# Altium integrated library WiC_v13.2.IntLib: 100 symbols
Pins are listed as number, name and electrical type; pins without a type are passive.

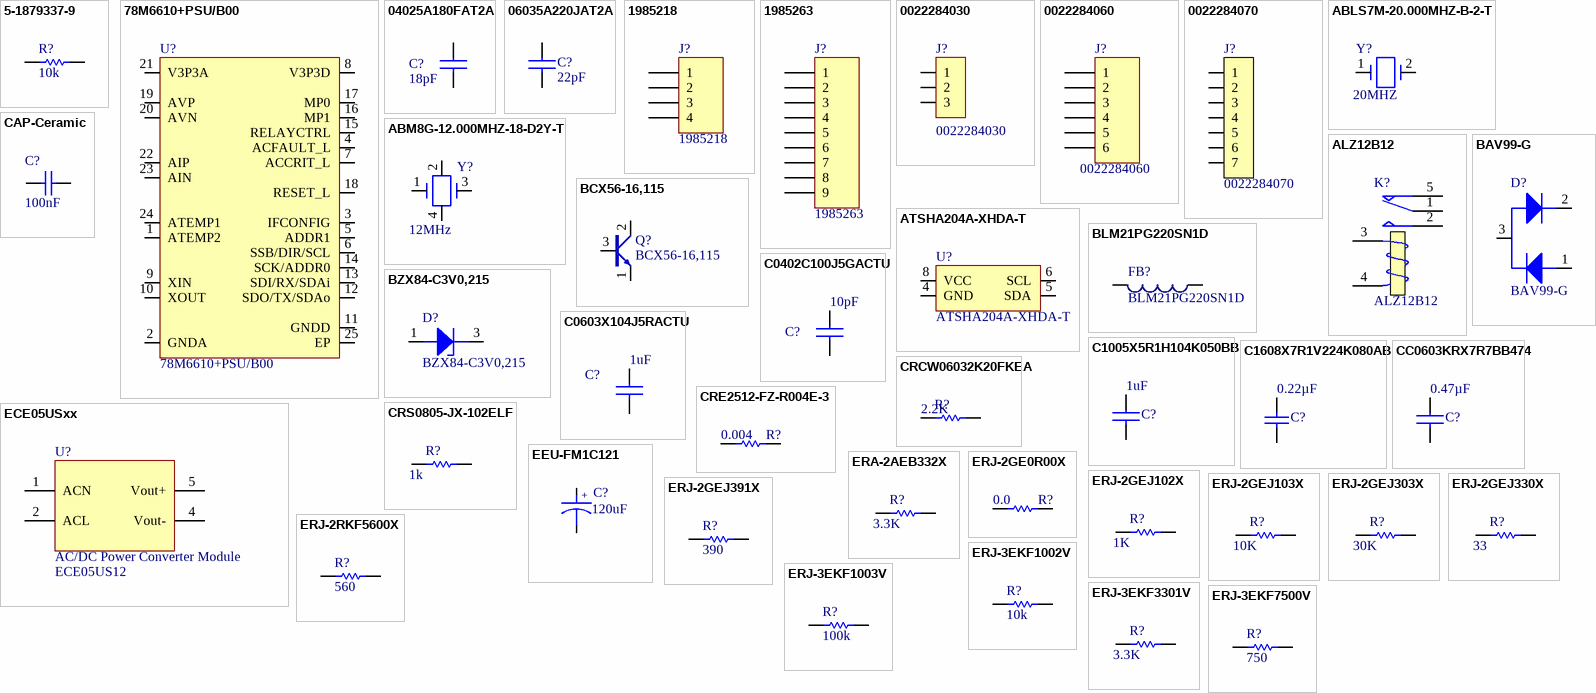
[diagram p0: symbols 5-1879337-9 to ERJ-3EKF7500V]

## 5-1879337-9
designator R?  value 10k  (hidden comment: 5-1879337-9)
RES SMD 10K OHM 1% 1/16W 0603; MFT: TE Connectivity AMP Connectors; RATING: 0.063W; MPN: 5-1879337-9; TYPE: SMD; LOAD: *
footprint R0603
pins: 1, 2

## 78M6610+PSU/B00
designator U?
IC ENERGY MEASURMENT 1PH 24TQFN; MFT: Maxim Integrated; RATING: *; VALUE: 78M6610+PSU/B00; LOAD: *; TYPE: SMD; MPN: 78M6610+PSU/B00
footprint QFN-24 (4X4mm)
pins: 1 ATEMP2, 2 GNDA, 3 IFCONFIG, 4 ACFAULT_L, 5 ADDR1, 6 SSB/DIR/SCL, 7 ACCRIT_L, 8 V3P3D, 9 XIN, 10 XOUT, 11 GNDD, 12 SDO/TX/SDAo, 13 SDI/RX/SDAi, 14 SCK/ADDR0, 15 RELAYCTRL, 16 MP1, 17 MP0, 18 RESET_L, 19 AVP, 20 AVN, 21 V3P3A, 22 AIP, 23 AIN, 24 ATEMP1, 25 EP

## 04025A180FAT2A
designator C?  value 18pF  (hidden comment: 04025A180FAT2A)
CAP CER 18PF 50V 1% NP0 0402; MFT: AVX Corporation; TYPE: SMD; MPN: 04025A180FAT2A; LOAD: *; RATING: 50V
footprint C0402
pins: 1, 2

## 06035A220JAT2A
designator C?  value 22pF  (hidden comment: 06035A220JAT2A)
CAP CER 22PF 50V NP0 0603; MFT: AVX Corporation; TYPE: SMD; MPN: 06035A220JAT2A; RATING: 50V; LOAD: *
footprint C0603
pins: 1, 2

## 1985218
designator J?
Fixed Terminal Blocks PTSA 1.5/4-3.5-Z; MFT: Phoenix Contact; LOAD: *; RATING: *; TYPE: TH; VALUE: 1985218; MPN: 1985218
footprint 1985218 (4pin)
pins: 1, 2, 3, 4

## 1985263
designator J?
TERM BLOCK PCB 9POS 3.5MM GREEN; MFT: Phoenix Contact; TYPE: TH; LOAD: *; VALUE: 1985263; RATING: *; MPN: 1985263
footprint 1985263 (9pin)
pins: 1, 2, 3, 4, 5, 6, 7, 8, 9

## 0022284030
designator J?
CONN HEADER 3POS .100 VERT TIN; MFT: Molex, LLC; TYPE: TH; VALUE: 0022284030; MPN: 0022284030
footprint 0022284030
pins: 1, 2, 3

## 0022284060
designator J?
CONN HEADER 6POS .100 VERT TIN; MFT: Molex Inc; TYPE: TH; VALUE: 0022284060; RATING: *; LOAD: *; MPN: 0022284060
footprint HDR1X6 (Connector; Header; 8 Position)
pins: 1, 2, 3, 4, 5, 6

## 0022284070
designator J?
CONN HEADER 7POS .100 VERT TIN; MFT: Molex, LLC; VALUE: 0022284070; TYPE: TH; RATING: *; LOAD: *; MPN: 0022284070
footprint 0022284070 (Header 7pin 2.54mm pitch)
pins: 1, 2, 3, 4, 5, 6, 7

## ABLS7M-20.000MHZ-B-2-T
designator Y?  value 20MHZ  (hidden comment: ABLS7M-20.000MHZ-B-2-T)
CRYSTAL 20.000 MHZ 18PF SMT; MFT: Abracon LLC; MPN: ABLS7M-20.000MHZ-B-2-T; TYPE: SMD; RATING: *; LOAD: *
footprint ABLS7M (crystal)
pins: 1, 2

## ABM8G-12.000MHZ-18-D2Y-T
designator Y?  value 12MHz  (hidden comment: ABM8G-12.000MHZ-18-D2Y-T)
ABRACON - ABM8G-12.000MHZ-18-D2Y-T - CRYSTAL, 12MHz,18pF, 3.2mm x 2.5mm SMD, FULL REEL; MFT: ABRACON; MPN: ABM8G-12.000MHZ-18-D2Y-T; LOAD: *; RATING: *; TYPE: SMD
footprint 4SMD-crystal
pins: 1, 2, 3, 4

## ALZ12B12
designator K?
General Purpose Relays 16A 12VDC SPDT CLASS B; MFT: Panasonic Industrial Devices; VALUE: ALZ12B12; TYPE: TH; MPN: ALZ12B12
footprint ALZ12B12 (custom)
pins: 1 COM, 2 NO, 3 T1, 4 T2, 5 NC

## ATSHA204A-XHDA-T
designator U?
IC CRYPTO 4.5KB I2C; MFT: Microchip Technology; LOAD: *; TYPE: SMD; RATING: *; VALUE: ATSHA204A-XHDA-T; MPN: ATSHA204A-XHDA-T
footprint TSSOP-8 (wide Body)
pins: 4 GND, 5 SDA, 6 SCL, 8 VCC

## BAV99-G
designator D?
DIODE ARRAY GP 70V 215MA SOT23; MFT: Comchip Technology; TYPE: SMD; RATING: 70V; LOAD: *; VALUE: BAV99-G; MPN: BAV99-G
footprint SOT-23
pins: 1, 2, 3

## BCX56-16,115
designator Q?
TRANS NPN MED 1A 80V SOT89; MFT: NXP Semiconductors; TYPE: SMD; LOAD: *; RATING: 80V; VALUE: BCX56-16,115; MPN: BCX56-16,115
footprint SOT 89-3
pins: 1 emitter, 2 collector, 3 base

## BLM21PG220SN1D
designator FB?
FERRITE CHIP 22 OHM 0805; Manufacturer: Murata Electronics North America; TYPE: SMD; VALUE: BLM21PG220SN1D; RATING: *; LOAD: *; Manufacturer Part Number: BLM21PG220SN1D
footprint 0805 (FERRITE)
pins: 1, 2

## BZX84-C3V0,215
designator D?
DIODE ZENER 3V 250MW TO236AB; MFT: NXP Semiconductors; TYPE: SMD; LOAD: *; RATING: 3V; VALUE: BZX84-C3V0,215; MPN: BZX84-C3V0,215
footprint SOT-23(TO-236AB)
pins: 1 A, 3 K

## C0402C100J5GACTU
designator C?  value 10pF  (hidden comment: C0402C100J5GACTU)
CAP CER 10PF 50V 5% NP0 0402; MFT: Kemet; TYPE: SMD; MPN: C0402C100J5GACTU; LOAD: *; RATING: 50V
footprint C0402
pins: 1, 2

## C0603X104J5RACTU
designator C?  value 1uF  (hidden comment: C0603X104J5RACTU)
CAP CER 0.1UF 50V X7R 0603; MFT: Kemet; TYPE: SMD; MPN: C0603X104J5RACTU; RATING: 50V; LOAD: *
footprint C0603
pins: 1, 2

## C1005X5R1H104K050BB
designator C?  value 1uF  (hidden comment: C1005X5R1H104K050BB)
CAP CER 0.1UF 50V 10% X5R 0402; MFT: TDK Corporation; TYPE: SMD; MPN: C1005X5R1H104K050BB; RATING: 50V; LOAD: *
footprint C0402
pins: 1, 2

## C1608X7R1V224K080AB
designator C?  value 0.22µF  (hidden comment: C1608X7R1V224K080AB)
CAP CER 0.22UF 35V X7R 0603; MFT: TDK Corporation; TYPE: SMD; MPN: C1608X7R1V224K080AB; RATING: 35V
footprint C0603
pins: 1, 2

## CAP-Ceramic
designator C?, comment value 100nF  (hidden comment: Capacitor Ceramic)
Ceramic Capacitor; FUNCTION: ANA-OUT
footprint CAP-0603 (Chip Resistor, Body 0.6x0.3mm, IPC Medium Density)
footprint CAP-0805 (SMD Capacitor 0805)
pins: 1, 2

## CC0603KRX7R7BB474
designator C?  value 0.47µF  (hidden comment: CC0603KRX7R7BB474)
CAP CER 0.47UF 16V X7R 0603; MFT: Yageo; TYPE: SMD; MPN: CC0603KRX7R7BB474; RATING: 16V
footprint C0603
pins: 1, 2

## CRCW06032K20FKEA
designator R?  value 2.2K  (hidden comment: CRCW06032K20FKEA)
RES SMD 2.2K OHM 1% 1/10W 0603; MFT: Vishay Dale; MPN: CRCW06032K20FKEA; TYPE: SMD; RATING: 1/10W
footprint R0603
pins: 1, 2

## CRE2512-FZ-R004E-3
designator R?  value 0.004  (hidden comment: CRE2512-FZ-R004E-3)
RES SMD 0.004 OHM 1% 3W 2512; MFT: Bourns Inc.; MPN: CRE2512-FZ-R004E-3; LOAD: *; TYPE: SMD; RATING: 3W
footprint R2512
pins: 1, 2

## CRS0805-JX-102ELF
designator R?  value 1k  (hidden comment: CRS0805-JX-102ELF)
Thick Film Resistors - SMD 1kohms .25W 5% TCR100 RES SMD; MFT: Bourns; MPN: CRS0805-JX-102ELF; TYPE: SMD; RATING: .25W; LOAD: *
footprint RES-0805
pins: 1, 2

## ECE05USxx
designator U?, comment AC/DC Power Converter Module  MPN: ECE05US12
AC/DC CONVERTER 12V 5W; MFT: XP Power; VALUE: ECE05US12; RATING: 12V 5W; LOAD: *; TYPE: TH
footprint ECE05
pins: 1 ACN, 2 ACL, 4 Vout-, 5 Vout+

## EEU-FM1C121
designator C?  value 120uF
CAP ALUM 120UF 20% 16V RADIAL; MPN: EEU-FM1C121; MFT: Panasonic Electronic Components; TYPE: TH; RATING: 16V
footprint RB.1
pins: 1, 2
text: +

## ERA-2AEB332X
designator R?  value 3.3K  (hidden comment: ERA-2AEB332X)
RES SMD 3.3K OHM 0.1% 1/16W 0402; MFT: Panasonic Electronic Components; MPN: ERA-2AEB332X; LOAD: *; RATING: 1/16W; TYPE: SMD
pins: 1, 2

## ERJ-2GE0R00X
designator R?  value 0.0  (hidden comment: ERJ-2GE0R00X)
RES SMD 0.0 OHM JUMPER 1/10W; MFT: Panasonic Electronic Components; MPN: ERJ-2GE0R00X; TYPE: SMD; RATING: 1/10W; LOAD: *
footprint R0402
pins: 1, 2

## ERJ-2GEJ102X
designator R?  value 1K  (hidden comment: ERJ-2GEJ102X)
RES SMD 1K OHM 5% 1/10W 0402; MFT: Panasonic Electronic Components; MPN: ERJ-2GEJ102X; TYPE: SMD; LOAD: *; RATING: 1/10W
footprint R0402
pins: 1, 2

## ERJ-2GEJ103X
designator R?  value 10K  (hidden comment: ERJ-2GEJ103X)
RES SMD 10K OHM 5% 1/10W 0402; MFT: Panasonic Electronic Components; MPN: ERJ-2GEJ103X; LOAD: *; RATING: 1/10W; TYPE: SMD
footprint R0402
pins: 1, 2

## ERJ-2GEJ303X
designator R?  value 30K  (hidden comment: ERJ-2GEJ303X)
RES SMD 30K OHM 5% 1/10W 0402; MFT: Panasonic Electronic Components; MPN: ERJ-2GEJ303X; LOAD: *; TYPE: SMD; RATING: 1/10W
footprint R0402
pins: 1, 2

## ERJ-2GEJ330X
designator R?  value 33  (hidden comment: ERJ-2GEJ330X)
RES SMD 33 OHM 5% 1/10W 0402; MFT: Panasonic Electronic Components; MPN: ERJ-2GEJ330X; LOAD: *; TYPE: SMD; RATING: 1/10W
footprint R0402
pins: 1, 2

## ERJ-2GEJ391X
designator R?  value 390  (hidden comment: ERJ-2GEJ391X)
RES SMD 390 OHM 5% 1/10W 0402; MFT: Panasonic Electronic Components; MPN: ERJ-2GEJ391X; TYPE: SMD; RATING: 1/10W; LOAD: *
footprint R0402
pins: 1, 2

## ERJ-2RKF5600X
designator R?  value 560  (hidden comment: ERJ-2RKF5600X)
RES SMD 560 OHM 1% 1/10W 0402; MFT: Panasonic Electronic Components; MPN: ERJ-2RKF5600X; RATING: 1/10W; LOAD: *; TYPE: SMD
footprint R0402
pins: 1, 2

## ERJ-3EKF1002V
designator R?  value 10k  (hidden comment: ERJ-3EKF1002V)
RES SMD 10K OHM 1% 1/10W 0603; MFT: Panasonic Electronic Components; MPN: ERJ-3EKF1002V; TYPE: SMD; RATING: 1/10W; LOAD: *
footprint R0603
pins: 1, 2

## ERJ-3EKF1003V
designator R?  value 100k  (hidden comment: ERJ-3EKF1003V)
RES SMD 100K OHM 1% 1/10W 0603; MFT: Panasonic Electronic Components; MPN: ERJ-3EKF1003V; LOAD: *; RATING: 1/10W; TYPE: SMD
footprint R0603
pins: 1, 2

## ERJ-3EKF3301V
designator R?  value 3.3K  (hidden comment: ERJ-3EKF3301V)
RES SMD 3.3K OHM 1% 1/10W 0603; Manufacturer: Panasonic Electronic Components; Manufacturer Part Number: ERJ-3EKF3301V; LOAD: *; TYPE: SMD; RATING: 1/10W
footprint R0603
pins: 1, 2

## ERJ-3EKF7500V
designator R?  value 750  (hidden comment: ERJ-3EKF7500V)
RES SMD 750 OHM 1% 1/10W 0603; MFT: Panasonic Electronic Components; MPN: ERJ-3EKF7500V; RATING: 1/10W; LOAD: *; TYPE: SMD
footprint R0603
pins: 1, 2

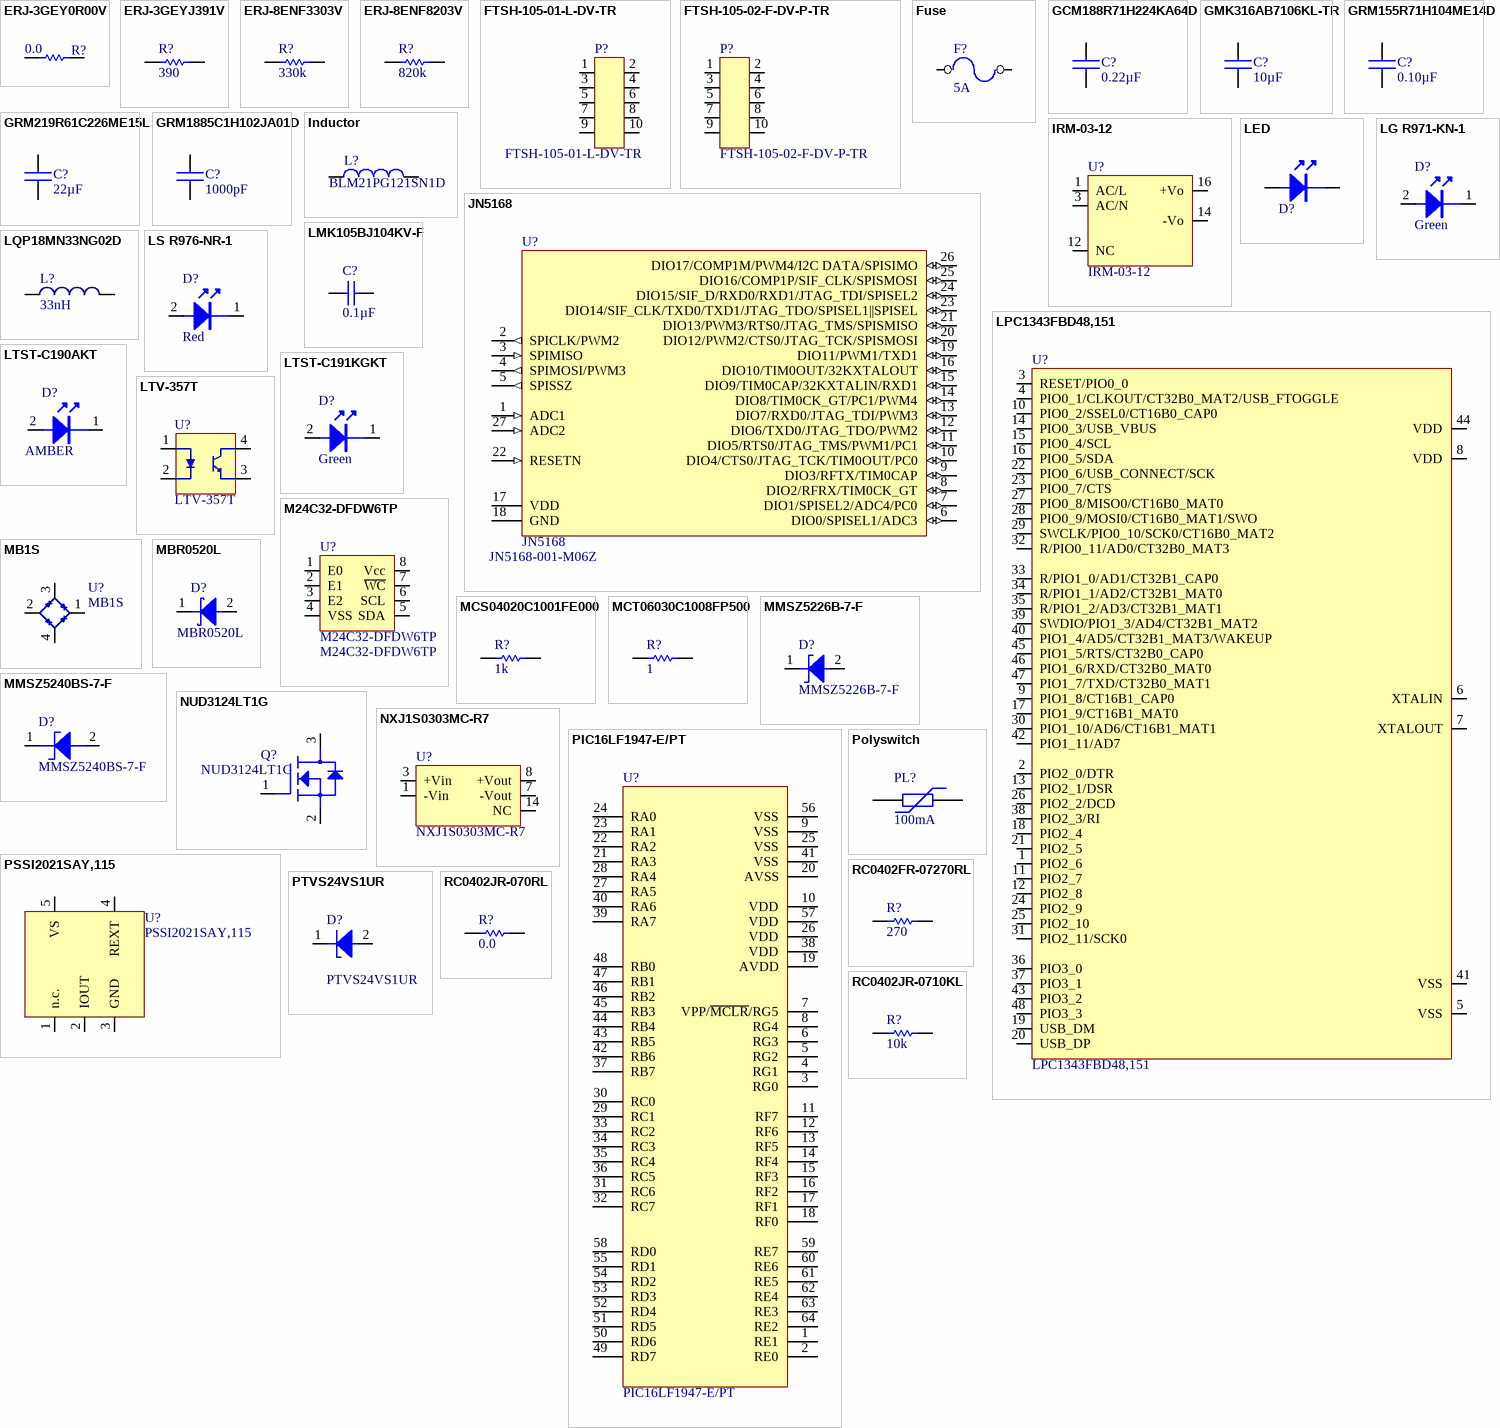
[diagram p1: symbols ERJ-3GEY0R00V to RC0402JR-0710KL]

## ERJ-3GEY0R00V
designator R?  value 0.0  (hidden comment: ERJ-3GEY0R00V)
RES SMD 0.0 OHM JUMPER 1/10W; Manufacturer: Panasonic Electronic Components; Manufacturer Part Number: ERJ-3GEY0R00V; TYPE: SMD; RATING: 1/10W; LOAD: *
footprint R0603
pins: 1, 2

## ERJ-3GEYJ391V
designator R?  value 390  (hidden comment: ERJ-3GEYJ391V)
RES SMD 390 OHM 5% 1/10W 0603; MFT: Panasonic Electronic Components; MPN: ERJ-3GEYJ391V; LOAD: *; RATING: 1/10W; TYPE: SMD
footprint R0603
pins: 1, 2

## ERJ-8ENF3303V
designator R?  value 330k  (hidden comment: ERJ-8ENF3303V)
RES SMD 330K OHM 1% 1/4W 1206; MFT: Panasonic Electronic Components; MPN: ERJ-8ENF3303V; TYPE: SMD; RATING: 1/4W; LOAD: *
footprint R1206
pins: 1, 2

## ERJ-8ENF8203V
designator R?  value 820k  (hidden comment: ERJ-8ENF8203V)
RES SMD 820K OHM 1% 1/4W 1206; Manufacturer: Panasonic Electronic Components; Manufacturer Part Number: ERJ-8ENF8203V; LOAD: *; RATING: 1/4W; TYPE: SMD
footprint R1206
pins: 1, 2

## FTSH-105-01-L-DV-TR
designator P?
CONN HEADER 10POS DUAL .05" SMD; MFT: Samtec Inc; TYPE: SMD; VALUE: FTSH-105-01-L-DV-TR; RATING: *; LOAD: *; MPN: FTSH-105-01-L-DV-TR
footprint FTSH-1XX (1.27mmPitch)
pins: 1, 2, 3, 4, 5, 6, 7, 8, 9, 10

## FTSH-105-02-F-DV-P-TR
designator P?
CONN HEADER 10POS DUAL .05" SMD; MFT: Samtec Inc.; TYPE: SMD; VALUE: FTSH-105-02-F-DV-P-TR; LOAD: *; RATING: *; MPN: FTSH-105-02-F-DV-P-TR
footprint 20021121-00010C4LF
pins: 1, 2, 3, 4, 5, 6, 7, 8, 9, 10

## Fuse
designator F?  value 5A  (hidden comment: Fuse)
FUSE BOARD MOUNT 5A 250VAC RAD; MPN: SS-5-5A-AP; MFT: Eaton Bussmann; TYPE: TH; LOAD: *; RATING: *
footprint SS-5-5A-AP
pins: 1, 2

## GCM188R71H224KA64D
designator C?  value 0.22µF  (hidden comment: GCM188R71H224KA64D)
CAP CER 0.22UF 50V X7R 0603; MFT: Murata Electronics North America; TYPE: SMD; MPN: GCM188R71H224KA64D; RATING: 50V
footprint C0603
pins: 1, 2

## GMK316AB7106KL-TR
designator C?  value 10µF  (hidden comment: GMK316AB7106KL-TR)
CAP CER 10UF 35V 10% X7R 1206; MFT: Taiyo Yuden; TYPE: SMD; MPN: GMK316AB7106KL-TR; RATING: 35V; LOAD: *
footprint C1206
pins: 1, 2

## GRM155R71H104ME14D
designator C?  value 0.10µF  (hidden comment: GRM155R71H104ME14D)
CAP CER 0.1UF 50V X7R 0402; MFT: Murata Electronics North America; TYPE: SMD; MPN: GRM155R71H104ME14D; RATING: 50V; LOAD: *
footprint C0402
pins: 1, 2

## GRM219R61C226ME15L
designator C?  value 22µF  (hidden comment: GRM219R61C226ME15L)
CAP CER 22UF 16V 20% X5R 0805; MFT: Murata Electronics North America; TYPE: SMD; MPN: GRM219R61C226ME15L; RATING: 16V 20% X5R
footprint C0805
pins: 1, 2

## GRM1885C1H102JA01D
designator C?  value 1000pF  (hidden comment: GRM1885C1H102JA01D)
CAP CER 1000PF 50V 5% NP0 0603; MFT: Murata Electronics North America; TYPE: SMD; MPN: GRM1885C1H102JA01D; RATING: 50V; LOAD: *
footprint C0603
pins: 1, 2

## Inductor
designator L?  MPN: BLM21PG121SN1D
FERRITE BEAD 120 OHM 0805 1LN; MFT: Murata Electronics North America; Value: BLM21PG121SN1D; TYPE: SMD; LOAD: *; RATING: *
footprint BOBINA
footprint RES-0805 (SMD Resistor 0805)
pins: 1, 2

## IRM-03-12
designator U?
AC/DC Power Modules 85-305Vac 12Vout 250mA 3W PCM mnt; MFT: Mean Well; TYPE: TH; VALUE: IRM-03-12; MPN: IRM-03-12
footprint IRM-03-12
pins: 1 AC/L, 3 AC/N, 12 NC, 14 -Vo, 16 +Vo

## JN5168
designator U?  MPN: JN5168-001-M06Z
Jennic Module; MFT: NXP; VALUE: JN5168-001-M06Z; RATING: *; LOAD: *; TYPE: SMD
footprint JN5168-001-M06
pins: 1 ADC1 (in), 2 SPICLK/PWM2 (out), 3 SPIMISO (in), 4 SPIMOSI/PWM3 (out), 5 SPISSZ (out), 6 DIO0/SPISEL1/ADC3 (io), 7 DIO1/SPISEL2/ADC4/PC0 (io), 8 DIO2/RFRX/TIM0CK_GT (io), 9 DIO3/RFTX/TIM0CAP (io), 10 DIO4/CTS0/JTAG_TCK/TIM0OUT/PC0 (io), 11 DIO5/RTS0/JTAG_TMS/PWM1/PC1 (io), 12 DIO6/TXD0/JTAG_TDO/PWM2 (io), 13 DIO7/RXD0/JTAG_TDI/PWM3 (io), 14 DIO8/TIM0CK_GT/PC1/PWM4 (io), 15 DIO9/TIM0CAP/32KXTALIN/RXD1 (io), 16 DIO10/TIM0OUT/32KXTALOUT (io), 17 VDD (power), 18 GND (power), 19 DIO11/PWM1/TXD1 (io), 20 DIO12/PWM2/CTS0/JTAG_TCK/SPISMOSI (io), 21 DIO13/PWM3/RTS0/JTAG_TMS/SPISMISO (io), 22 RESETN (in), 23 DIO14/SIF_CLK/TXD0/TXD1/JTAG_TDO/SPISEL1||SPISEL (io), 24 DIO15/SIF_D/RXD0/RXD1/JTAG_TDI/SPISEL2 (io), 25 DIO16/COMP1P/SIF_CLK/SPISMOSI (io), 26 DIO17/COMP1M/PWM4/I2C DATA/SPISIMO (io), 27 ADC2 (in)

## LED
designator D?  (value not drawn)
LED Blue; Color: Red; FUNCTION: TOP
footprint LED
footprint LED-0805 (SMD Led 0805)
footprint LED-0603 (Chip Led)
footprint LED-0603 (Chip Led)
pins: 1, 2

## LG R971-KN-1
designator D?  value Green  (hidden comment: LG R971-KN-1)
LED CHIPLED 570NM GREEN 0805 SMD; MFT: OSRAM Opto Semiconductors Inc.; MPN: LG R971-KN-1; TYPE: SMD
footprint LED0805(GREEN)
pins: 1, 2

## LMK105BJ104KV-F
designator C?  value 0.1µF  (hidden comment: LMK105BJ104KV-F)
CAP CER 0.1UF 10V 10% X5R 0402; MFT: Taiyo Yuden; TYPE: SMD; MPN: LMK105BJ104KV-F
footprint C0402
pins: 1, 2

## LPC1343FBD48,151
designator U?
IC MCU ARM 32KB FLASH 48LQFP; MFT: NXP Semiconductors; LOAD: *; VALUE: LPC1343FBD48,151; RATING: *; TYPE: SMD; MPN: LPC1343FBD48,151
footprint LQFP-48(7x7mm body)
pins: 1 PIO2_6, 2 PIO2_0/DTR, 3 RESET/PIO0_0, 4 PIO0_1/CLKOUT/CT32B0_MAT2/USB_FTOGGLE, 5 VSS, 6 XTALIN, 7 XTALOUT, 8 VDD, 9 PIO1_8/CT16B1_CAP0, 10 PIO0_2/SSEL0/CT16B0_CAP0, 11 PIO2_7, 12 PIO2_8, 13 PIO2_1/DSR, 14 PIO0_3/USB_VBUS, 15 PIO0_4/SCL, 16 PIO0_5/SDA, 17 PIO1_9/CT16B1_MAT0, 18 PIO2_4, 19 USB_DM, 20 USB_DP, 21 PIO2_5, 22 PIO0_6/USB_CONNECT/SCK, 23 PIO0_7/CTS, 24 PIO2_9, 25 PIO2_10, 26 PIO2_2/DCD, 27 PIO0_8/MISO0/CT16B0_MAT0, 28 PIO0_9/MOSI0/CT16B0_MAT1/SWO, 29 SWCLK/PIO0_10/SCK0/CT16B0_MAT2, 30 PIO1_10/AD6/CT16B1_MAT1, 31 PIO2_11/SCK0, 32 R/PIO0_11/AD0/CT32B0_MAT3, 33 R/PIO1_0/AD1/CT32B1_CAP0, 34 R/PIO1_1/AD2/CT32B1_MAT0, 35 R/PIO1_2/AD3/CT32B1_MAT1, 36 PIO3_0, 37 PIO3_1, 38 PIO2_3/RI, 39 SWDIO/PIO1_3/AD4/CT32B1_MAT2, 40 PIO1_4/AD5/CT32B1_MAT3/WAKEUP, 41 VSS, 42 PIO1_11/AD7, 43 PIO3_2, 44 VDD, 45 PIO1_5/RTS/CT32B0_CAP0, 46 PIO1_6/RXD/CT32B0_MAT0, 47 PIO1_7/TXD/CT32B0_MAT1, 48 PIO3_3

## LQP18MN33NG02D
designator L?  value 33nH  (hidden comment: LQP18MN33NG02D)
FIXED IND 33NH 100MA 2.8 OHM SMD; MFT: Murata Electronics North America; MPN: LQP18MN33NG02D; TYPE: SMD; RATING: 100MA 2.8 OHM; LOAD: *
footprint 0603 INDUCTOR
pins: 1, 2

## LS R976-NR-1
designator D?  value Red  (hidden comment: LS R976-NR-1)
LED CHIPLED 633NM RED 0805 SMD; MFT: OSRAM Opto Semiconductors Inc.; MPN: LS R976-NR-1; TYPE: SMD; RATING: *
footprint LED0805 - (RED)
pins: 1, 2

## LTST-C190AKT
designator D?  value AMBER  (hidden comment: LTST-C190AKT)
LED AMBER CLEAR 0603 SMD; MFT: Lite-On Inc; TYPE: SMD; LOAD: *; RATING: *; MPN: LTST-C190AKT
footprint LED_0603 (orange)
pins: 1, 2

## LTST-C191KGKT
designator D?  value Green  (hidden comment: LTST-C191KGKT)
LED GREEN CLEAR THIN 0603 SMD; MFT: Lite-On Inc; RATING: Optoelectronics; MPN: LTST-C191KGKT; TYPE: SMD; LOAD: *
footprint LED_0603 (green)
pins: 1, 2

## LTV-357T
designator U?
OPTOISOLATOR 3.75KV TRANS 4-SOP; MFT: Lite-On Inc.; TYPE: SMD; RATING: 3.75KV; VALUE: LTV-357T; LOAD: *; MPN: LTV-357T
footprint 4SMD(gull wing)
pins: 1 Anode, 2 Cathode, 3 Emitter, 4 Collector

## M24C32-DFDW6TP
designator U?
IC EEPROM 32KBIT 400KHZ 8TSSOP; MFT: STMicroelectronics; TYPE: SMD; VALUE: M24C32-DFDW6TP; RATING: *; LOAD: *; MPN: M24C32-DFDW6TP
footprint 8-TSSOP (IC EEPROM 128KBIT 1MHZ 8TSSOP)
pins: 1 E0, 2 E1, 3 E2, 4 VSS, 5 SDA, 6 SCL, 7 ~{WC}, 8 Vcc

## MB1S
designator U?
IC BRIDGE RECT 0.5A 100V 4-SOIC; MFT: Fairchild Semiconductor; TYPE: SMD; VALUE: MB1S; RATING: *; LOAD: *; MPN: MB1S
footprint SOIC-4
pins: 1, 2, 3, 4

## MBR0520L
designator D?
DIODE SCHOTTKY 20V 0.5A SOD123; MFT: Fairchild Semiconductor; TYPE: SMD; LOAD: *; VALUE: MBR0520L; RATING: 20V; MPN: MBR0520L
footprint SOD123
footprint SOD123_4
pins: 1 cathode, 2 anode

## MCS04020C1001FE000
designator R?  value 1k  (hidden comment: MCS04020C1001FE000)
RES SMD 1K OHM 1% 1/10W 0402; MFT: Vishay Beyschlag; MPN: MCS04020C1001FE000; TYPE: SMD; RATING: 1/10W; LOAD: *
footprint R0402
pins: 1, 2

## MCT06030C1008FP500
designator R?  value 1  (hidden comment: MCT06030C1008FP500)
RES SMD 1 OHM 1% 1/8W 0603; MFT: Vishay Beyschlag; MPN: MCT06030C1008FP500; TYPE: SMD; RATING: *; LOAD: *
footprint R0603
pins: 1, 2

## MMSZ5226B-7-F
designator D?
DIODE ZENER 3.3V 500MW SOD123; MFT: Diodes Incorporated; TYPE: SMD; RATING: 3.3V 500MW; VALUE: MMSZ5226B-7-F; LOAD: *; MPN: MMSZ5226B-7-F
footprint SOD123
pins: 1 cathode, 2 anode

## MMSZ5240BS-7-F
designator D?
DIODE ZENER 10V 200MW SOD323; MFT: Diodes; TYPE: SMD; VALUE: MMSZ5240BS-7-F; RATING: 10V 200MW; LOAD: *; MPN: MMSZ5240BS-7-F
footprint SOD-323
pins: 1 K, 2 A

## NUD3124LT1G
designator Q?
IC INDCT LOAD DRVR AUTO SOT23; MFT: ON Semiconductor; TYPE: SMD; VALUE: NUD3124LT1G; MPN: NUD3124LT1G
footprint SOT-23-3
pins: 1 gate, 2 source, 3 drain

## NXJ1S0303MC-R7
designator U?
Isolated DC/DC Converters 1W 3.3Vin 3.3Vout 333mA SM; MFT: Murata Power Solutions; TYPE: SMD; VALUE: NXJ1S0303MC-R7; MPN: NXJ1S0303MC-R7
footprint NXJ1S0303MC-R7
pins: 1 -Vin, 3 +Vin, 7 -Vout, 8 +Vout, 14 NC

## PIC16LF1947-E/PT
designator U?
IC MCU 8BIT 28KB FLASH 64TQFP; MFT: Microchip Technology; VALUE: PIC16LF1947-E/PT; TYPE: SMD; MPN: PIC16LF1947-E/PT
footprint TQFP-64
pins: 1 RE1, 2 RE0, 3 RG0, 4 RG1, 5 RG2, 6 RG3, 7 VPP/~{MCLR}/RG5, 8 RG4, 9 VSS, 10 VDD, 11 RF7, 12 RF6, 13 RF5, 14 RF4, 15 RF3, 16 RF2, 17 RF1, 18 RF0, 19 AVDD, 20 AVSS, 21 RA3, 22 RA2, 23 RA1, 24 RA0, 25 VSS, 26 VDD, 27 RA5, 28 RA4, 29 RC1, 30 RC0, 31 RC6, 32 RC7, 33 RC2, 34 RC3, 35 RC4, 36 RC5, 37 RB7, 38 VDD, 39 RA7, 40 RA6, 41 VSS, 42 RB6, 43 RB5, 44 RB4, 45 RB3, 46 RB2, 47 RB1, 48 RB0, 49 RD7, 50 RD6, 51 RD5, 52 RD4, 53 RD3, 54 RD2, 55 RD1, 56 VSS, 57 VDD, 58 RD0, 59 RE7, 60 RE6, 61 RE5, 62 RE4, 63 RE3, 64 RE2

## Polyswitch
designator PL?  value 100mA  (hidden comment: Polyswitch)
PTC RESET FUSE 30V 100MA 1210; MPN: MICROSMD010F-2; MFT: TE Connectivity; TYPE: SMD; RATING: 30V; LOAD: *
footprint 3216[1206]3232 (Chip Resistor; Body 3.2 x 1.6 mm (LxW typ))
footprint IND-1206 (Chip Resistor; Body 3.2 x 1.6 mm (LxW typ))
pins: 1, 2

## PSSI2021SAY,115
designator U?
NXP - PSSI2021SAY,115 - IC, CURRENT REGULATOR, 75V, 50MA, 5-SOT-353, FULL REEL; MFT: NXP; LOAD: *; RATING: 75V, 50MA,; VALUE: PSSI2021SAY,115; TYPE: SMD; MPN: PSSI2021SAY,115
footprint SOT353
pins: 1 n.c., 2 IOUT, 3 GND, 4 REXT, 5 VS

## PTVS24VS1UR
designator D?
NXP - PTVS24VS1UR - DIODE, TVS, UNI, 24V, 400W, SOD123W; TYPE: SMD; MFT: NXP; VALUE: PTVS24VS1UR; RATING: 24V, 400W; LOAD: *; MPN: PTVS24VS1UR
footprint SOD123
pins: 1 cathode, 2 anode

## RC0402FR-07270RL
designator R?  value 270  (hidden comment: RC0402FR-07270RL)
RES SMD 270 OHM 1% 1/16W 0402; MFT: Yageo; MPN: RC0402FR-07270RL; RATING: 1/16W; TYPE: SMD
footprint R0402
pins: 1, 2

## RC0402JR-070RL
designator R?  value 0.0  (hidden comment: RC0402JR-070RL)
RES SMD 0.0OHM JUMPER 1/16W 0402; MFT: Yageo; MPN: RC0402JR-070RL; TYPE: SMD; RATING: 1/16W; LOAD: *
footprint R0402
pins: 1, 2

## RC0402JR-0710KL
designator R?  value 10k  (hidden comment: RC0402JR-0710KL)
RES SMD 10K OHM 5% 1/16W 0402; MFT: Yageo; MPN: RC0402JR-0710KL; TYPE: SMD; RATING: 1/16W
footprint R0402
pins: 1, 2

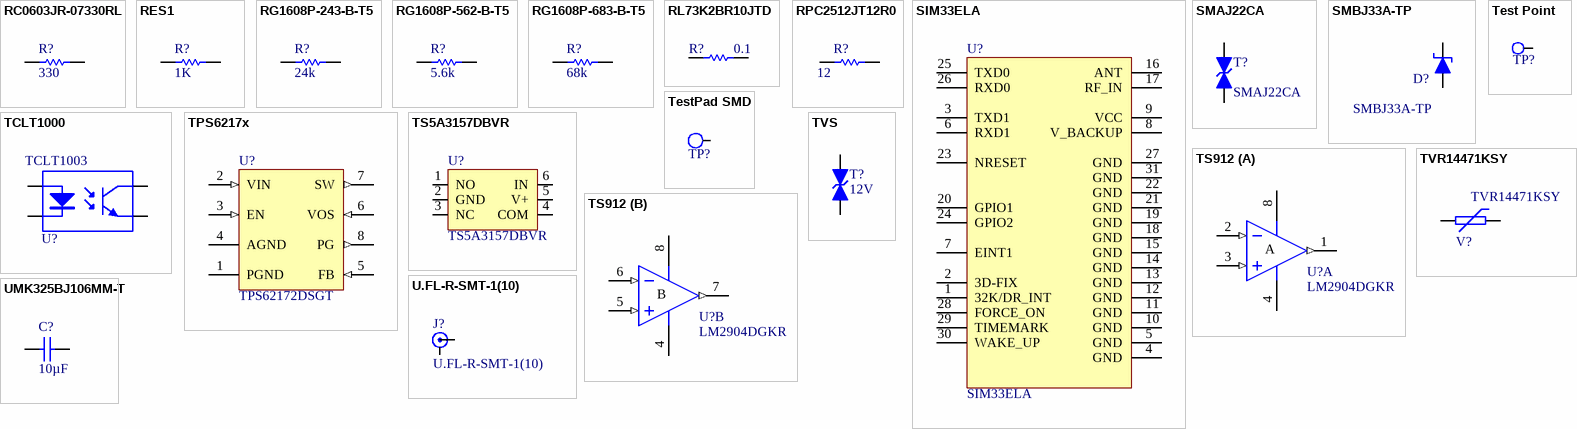
[diagram p2: symbols RC0603JR-07330RL to UMK325BJ106MM-T]

## RC0603JR-07330RL
designator R?  value 330  (hidden comment: RC0603JR-07330RL)
RES SMD 330 OHM 5% 1/10W 0603; MFT: Yageo; MPN: RC0603JR-07330RL; LOAD: *; RATING: 5% 1/10W; TYPE: SMD
footprint R0603
pins: 1, 2

## RES1
designator R?, comment value 1K  (hidden comment: Resistor)
FUNCTION: ANA-OUT
footprint RES-0603 (Chip Resistor, Body 0.6x0.3mm, IPC Medium Density)
pins: 1, 2

## RG1608P-243-B-T5
designator R?  value 24k  (hidden comment: RG1608P-243-B-T5)
RES SMD 24K OHM 0.1% 1/10W 0603; MFT: Susumu; RATING: 0.1W, 1/10W; MPN: RG1608P-243-B-T5; TYPE: SMD
footprint R0603
pins: 1, 2

## RG1608P-562-B-T5
designator R?  value 5.6k  (hidden comment: RG1608P-562-B-T5)
RES SMD 5.6K OHM 0.1% 1/10W 0603; MFT: Susumu; RATING: 0.1W, 1/10W; MPN: RG1608P-562-B-T5; TYPE: Surface Mount
footprint R0603
pins: 1, 2

## RG1608P-683-B-T5
designator R?  value 68k  (hidden comment: RG1608P-683-B-T5)
RES SMD 68K OHM 0.1% 1/10W 0603; MFT: Susumu; RATING: 0.1W; TYPE: Surface Mount; MPN: RG1608P-683-B-T5
footprint R0603
pins: 1, 2

## RL73K2BR10JTD
designator R?  value 0.1  (hidden comment: RL73K2BR10JTD)
Current Sense Resistors - SMD 0.1Ohm 1/4 W 200PPM; MFT: TE Connectivity; RATING: 1/4 W; MPN: RL73K2BR10JTD; TYPE: SMD; LOAD: *
footprint R1206
pins: 1, 2

## RPC2512JT12R0
designator R?  value 12  (hidden comment: RPC2512JT12R0)
RES SMD 12 OHM 5% 1.5W 2512; MFT: Stackpole Electronics Inc.; MPN: RPC2512JT12R0; RATING: 1.5W; LOAD: *; TYPE: SMD
footprint R2512
pins: 1, 2

## SIM33ELA
designator U?
A-GPS receiver, with built-in Antenna; MFT: SIMCom; TYPE: SMD; VALUE: SIM33ELA; MPN: SIM33ELA
footprint SIM33ELA
pins: 1 32K/DR_INT, 2 3D-FIX, 3 TXD1, 4 GND, 5 GND, 6 RXD1, 7 EINT1, 8 V_BACKUP, 9 VCC, 10 GND, 11 GND, 12 GND, 13 GND, 14 GND, 15 GND, 16 ANT, 17 RF_IN, 18 GND, 19 GND, 20 GPIO1, 21 GND, 22 GND, 23 NRESET, 24 GPIO2, 25 TXD0, 26 RXD0, 27 GND, 28 FORCE_ON, 29 TIMEMARK, 30 WAKE_UP, 31 GND

## SMAJ22CA
designator T?
TVS Diodes - Transient Voltage Suppressors 22Vr 400W 11.3A 5% BiDirectional; MFT: Littelfuse; TYPE: SMD; RATING: 22 V; VALUE: SMAJ22CA; MPN: SMAJ22CA
footprint DO-214AC
pins: 1 A, 2 K

## SMBJ33A-TP
designator D?
TVS DIODE 33VWM 53.3VC SMB; MFT: Micro Commercial Co; TYPE: SMD; RATING: 33V; VALUE: SMBJ33A-TP; MPN: SMBJ33A-TP
footprint DO-214AA, SMB
pins: 1 K, 2 A

## TCLT1000
designator U?, comment MPN: TCLT1003  (hidden comment: OptoIsolator)
OPTOISOLATR 5KV TRANSISTOR 4-SOP; MFT: Vishay Semiconductor Opto Division; VALUE: TCLT1003; LOAD: *; RATING: *; TYPE: SMD
footprint SOP-4L
pins: 1 A, 2 K, 3 A/K, 4 A/K

## Test Point
designator TP?  (value not drawn)
Test Point 1.27mm; FUNCTION: JENIC
footprint Test Point 1.27mm
pins: 1

## TestPad SMD
designator TP?  (value not drawn)
footprint TestPad SMD
pins: 1

## TPS6217x
designator U?, comment MPN: TPS62172DSGT  (hidden comment: Step-Down Converter)
IC REG BUCK 3.3V 0.5A SYNC 8WSON; MFT: Texas Instruments; VALUE: TPS62172DSGT; LOAD: *; RATING: 3.3V 0.5A; TYPE: SMD
footprint WSON8
pins: 1 PGND, 2 VIN (in), 3 EN (in), 4 AGND, 5 FB (in), 6 VOS (in), 7 SW (out), 8 PG (out)

## TS5A3157DBVR
designator U?
IC SWITCH SPDT SOT23-6; MFT: Texas Instruments; TYPE: SMD; VALUE: TS5A3157DBVR; RATING: *; LOAD: *; MPN: TS5A3157DBVR
footprint SOT-23-6
pins: 1 NO, 2 GND, 3 NC, 4 COM, 5 V+, 6 IN

## TS912
designator U?, comment MPN: LM2904DGKR  (hidden comment: Operational)
IC OPAMP GP 700KHZ 8VSSOP; MFT: Texas Instruments; VALUE: LM2904DGKR; LOAD: *; RATING: *; TYPE: SMD
footprint SOIC-8 (Small Outline; 8 Leads; Body Width 3.9 mm; Pitch 1.27 mm)
footprint DFN8 (DFN8 2x2mm footprint)
footprint MSOP-8 (Shrink Small Outline, MSOP; 8 Leads; Body Width 3 mm; Pitch 0.65 mm)
pins on every part: 4 V- (power), 8 V+ (power)
part A pins: 1 OUT (out), 2 IN- (in), 3 IN+ (in)
part B pins: 5 IN+ (in), 6 IN- (in), 7 OUT (out)
part A text: A
part B text: B

## TVR14471KSY
designator V?
MOV,SUPR,MOV,300Vrms,385VDC,0.6W,14mm,7.5mm; MFT: Thinking Electronic Industrial Co., Ltd; LOAD: *; RATING: 385VDC; TYPE: TH; VALUE: TVR14471KSY; MPN: TVR14471KSY
footprint TVR14 (varistor)
pins: 1, 2

## TVS
designator T?, comment value 12V  (hidden comment: Output Protection)
TVS DIODE 11V 18.2V DO214AC; MPN: SMAJ11CA; MFT: Littelfuse; TYPE: SMD; LOAD: *; RATING: 18.2V
footprint DO-214AC
pins: 1 A, 2 K

## U.FL-R-SMT-1(10)
designator J?
CONN UMC JACK STR 50 OHM SMD; MFT: Hirose Electric Co Ltd; LOAD: *; VALUE: U.FL-R-SMT-1(10); RATING: *; TYPE: SMD; MPN: U.FL-R-SMT-1(10)
footprint U.FL-R-SMT-1(10)
pins: 1 SIGNAL, 2 GND

## UMK325BJ106MM-T
designator C?  value 10µF  (hidden comment: UMK325BJ106MM-T)
CAP CER 10UF 50V 20% X5R 1210; MFT: Taiyo Yuden; TYPE: SMD; MPN: UMK325BJ106MM-T; RATING: 50V
footprint C1210
pins: 1, 2